# Altium footprint library SparkFun.PCBLIB: 674 footprints (part 11 of 44)
Each footprint in its own frame and in the unit in brackets; x right, y up, seen from the top. Pads: shape width x height; smd on the part's side, far side on the other; paste and mask are expansions set on the pad; w line width, h text height; cw(c..) or ccw(c..) is an arc to the next point about the centre after c.
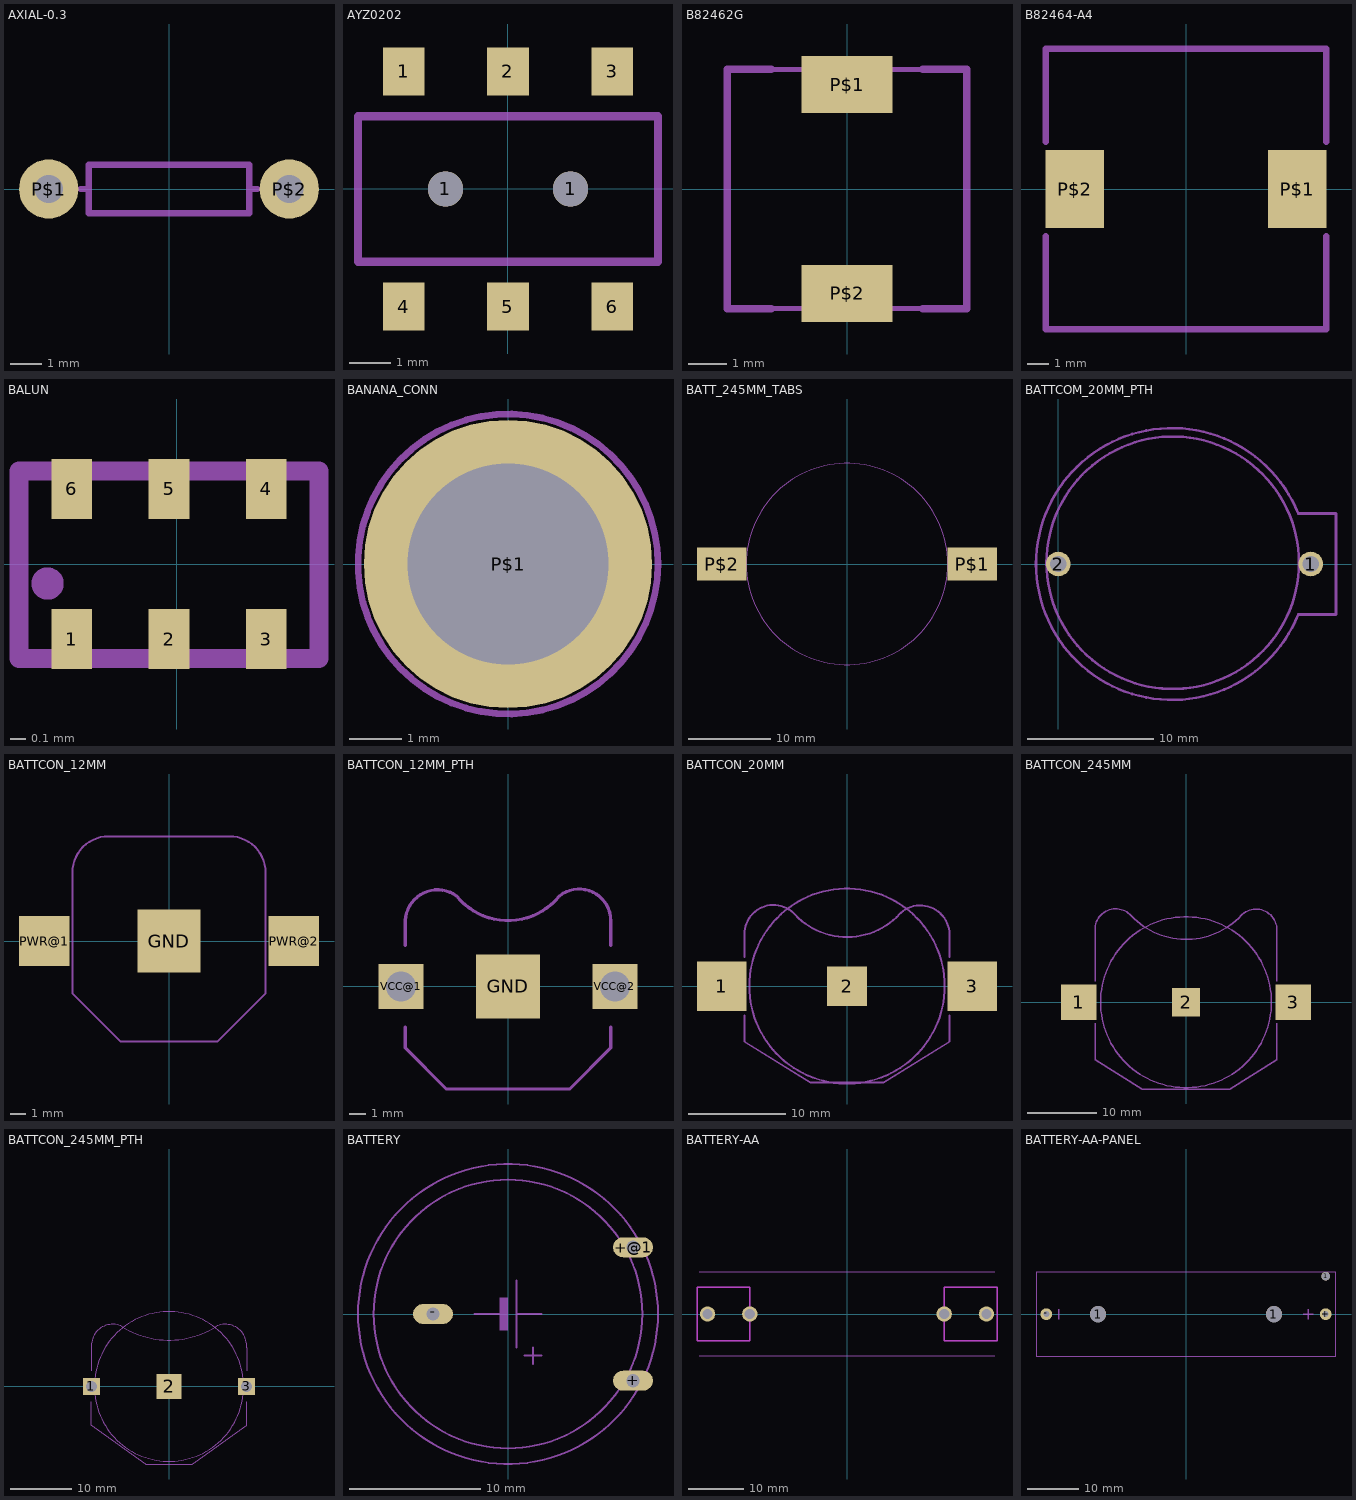
[diagram p10: the footprints below, top view; thin cyan lines are the x and y axes]

## AXIAL-0.3 [mil]
pads (2):
  round 74 hole 35.43: P$1(-150,0) P$2(150,0)
Mechanical 2:
  lines w8: -110,0 -100,0 ; 110,0 100,0 ; -100,0 -100,-30 100,-30 100,0 ; -100,0 -100,30 100,30 100,0

## AYZ0202 [mm]
pads (8):
  rect 1x1.15 smd: 1(-2.5,2.825) 2(0,2.825) 3(2.5,2.825) 4(-2.5,-2.825) 5(0,-2.825) 6(2.5,-2.825)
  round 0.85 hole 0.85: 1(-1.5,0) 1(1.5,0)
Mechanical 2:
  lines w0.203: -3.6,-1.75 -3.6,1.75 3.6,1.75 3.6,-1.75 -3.6,-1.75

## B82462G [mil]
pads (2):
  rect 94.49x59.06 smd: P$1(0,108.27) P$2(0,-108.27)
Mechanical 2:
  lines w8: -78.74,-124.02 -124.02,-124.02 -124.02,124.02 -78.74,124.02 ; 78.74,-124.02 124.02,-124.02 124.02,124.02 78.74,124.02
Mechanical 18:
  lines w5: -124.02,-124.02 -124.02,124.02 124.02,124.02 124.02,-124.02 -124.02,-124.02

## B82464-A4 [mil]
pads (2):
  rect 106.3x141.73 smd: P$1(202.76,0) P$2(-202.76,0)
Mechanical 2:
  lines w12: -255.91,-86.61 -255.91,-255.91 255.91,-255.91 255.91,-86.61 ; -255.91,86.61 -255.91,255.91 255.91,255.91 255.91,86.61

## BALUN [mm]
pads (6):
  rect 0.27x0.4 smd: 1(-0.7,-0.5) 2(-0.05,-0.5) 3(0.6,-0.5) 4(0.6,0.5) 5(-0.05,0.5) 6(-0.7,0.5)
Mechanical 2:
  circle w0.127: c-0.86,-0.13 r0.045
  lines w0.127: -0.98,-0.63 -1.05,-0.63 -1.05,0.21 -1.05,0.62 -0.95,0.62 ; -0.39,-0.63 -0.36,-0.63 ; -0.38,0.62 -0.36,0.62 ; 0.27,-0.63 0.29,-0.63 ; 0.27,0.62 0.28,0.62 ; 0.85,-0.63 0.95,-0.63 0.95,0.39 0.95,0.62 0.89,0.62
Mechanical 18:
  lines w0.127: -1.05,-0.63 0.95,-0.63 0.95,0.62 -1.05,0.62 -1.05,-0.63

## BANANA_CONN [mil]
pads (1):
  round 215 hole 150: P$1(0,0)
Mechanical 2:
  circle w5: c0,0 r111.8

## BATT_245MM_TABS [mm]
pads (2):
  rect 6x4 smd: P$1(15.24,0) P$2(-15.24,0)
Mechanical 18:
  circle w0.127: c0,0 r12.25

## BATTCOM_20MM_PTH [mil]
pads (2):
  round 76.77 hole 51.18: 1(787.4,0) 2(0,0)
Mechanical 2:
  lines w8: 748.03,-157.48 cw(c354.33,0) 748.03,157.48 866.14,157.48 866.14,-157.48 748.03,-157.48
Mechanical 18:
  circle w8: c356.69,3.94 r393.7

## BATTCON_12MM [mil]
pads (3):
  rect 156x156 smd: GND(0,0)
  rect 125x125 smd: PWR@1(-310,0) PWR@2(310,0)
Mechanical 2:
  lines w5: -240,-130 -120,-250 120,-250 240,-130 240,170 ccw(c150,170) 150,260 -150,260 ccw(c-150,170) -240,170 -240,-130

## BATTCON_12MM_PTH [mil]
pads (3):
  rect 156x156 smd: GND(0,0)
  rect 109.5x109.5 hole 73: VCC@1(-260,0) VCC@2(260,0)
Mechanical 2:
  lines w8: -250,-100 -250,-150 -150,-250 150,-250 250,-150 250,-100 ; -250,100 -250,160 cw(c-171.35,156.35) -125,220 ccw(c0,320.21) 125,220 cw(c173.12,160.04) 250,160 250,100

## BATTCON_20MM [mil]
pads (3):
  rect 200x200 smd: 1(-505,0) 3(505,0)
  rect 160x160 smd: 2(0,0)
Mechanical 2:
  lines w8: -413.39,-118.11 -413.39,-224.41 -145.67,-389.76 145.67,-389.76 413.39,-224.41 413.39,-118.11 ; -413.39,118.11 -413.39,208.66 cw(c-296.55,210.4) -208.66,287.4 ccw(c0.13,485.68) 212.6,291.34 ; 208.66,287.4 cw(c295.52,207.71) 413.39,208.66 413.39,118.11
Mechanical 18:
  circle w8: c0,0 r393.7

## BATTCON_245MM [mil]
pads (3):
  rect 200x200 smd: 1(-605,0) 3(605,0)
  rect 160x160 smd: 2(0,0)
Mechanical 2:
  lines w8: -513.39,-118.11 -513.39,-324.41 -245.67,-489.76 245.67,-489.76 513.39,-324.41 513.39,-118.11 ; -513.39,118.11 -513.39,408.66 cw(c-396.55,410.4) -308.66,487.4 ccw(c0.13,778.87) 312.6,491.34 ; 308.66,487.4 cw(c395.52,407.71) 513.39,408.66 513.39,118.11
Mechanical 18:
  circle w8: c0,0 r482.28

## BATTCON_245MM_PTH [mil]
pads (3):
  rect 109.5x109.5 hole 73: 1(-500,0) 3(500,0)
  rect 160x160 smd: 2(0,0)
Mechanical 2:
  lines w8: -500,-100 -500,-250 -150,-500 150,-500 500,-250 500,-100 ; -500,100 -500,250 cw(c-363.94,264.08) -300,385 ccw(c0,867.1) 300,385 cw(c363.94,264.07) 500,250 500,100
Mechanical 18:
  circle w8: c0,0 r482.28

## BATTERY [mil]
pads (3):
  oval 120x60 hole 40: +(375,-200) +@1(375,200) -(-225,0)
Mechanical 2:
  circle w6: c0,0 r450
  circle w6: c0,0 r403
  rectangle: -25,-50 0,50
  lines w6: -100,0 -25,0 ; 25,-100 25,0 ; 25,100 25,0 ; 50,-125 100,-125 ; 75,-150 75,-100 ; 100,0 25,0

## BATTERY-AA [mil]
pads (4):
  round 109.5 hole 73: GND@1(990,0) GND@2(690,0) PWR@1(-990,0) PWR@2(-690,0)
Mechanical 2:
  lines w10: -690,-85 -690,-190 -1065,-190 -1065,190 -690,190 -690,85 ; 690,-85 690,-190 1065,-190 1065,190 690,190 690,85
Mechanical 10 keep-out:
  lines w10: -1065,-190 -690,-190 -690,190 -1065,190 -1065,-190 ; 690,-190 1065,-190 1065,190 690,190 690,-190
Mechanical 18:
  lines w5: -1050,-300 1050,-300 ; -1050,300 1050,300

## BATTERY-AA-PANEL [mil]
pads (5):
  round 125.2 hole 125.2: 1(-679.92,0) 1(679.92,0)
  round 66.93 hole 66.93: 1(1079.92,294.09)
  round 90.55 hole 46.06: +(1079.92,0) -(-1079.92,0)
Mechanical 2:
  lines w9.84: -984.25,-39.37 -984.25,39.37 ; 905.51,0 984.25,0 ; 944.88,-39.37 944.88,39.37
Mechanical 18:
  lines w5: -1159.84,-325 -1159.84,325 1159.84,325 1159.84,-325 -1159.84,-325